# Altium footprint library B105ic.PcbLib: 84 footprints (part 6 of 6)
Each footprint in its own frame and in the unit in brackets; x right, y up, seen from the top. Pads: shape width x height; smd on the part's side, far side on the other; paste and mask are expansions set on the pad; w line width, h text height; cw(c..) or ccw(c..) is an arc to the next point about the centre after c.
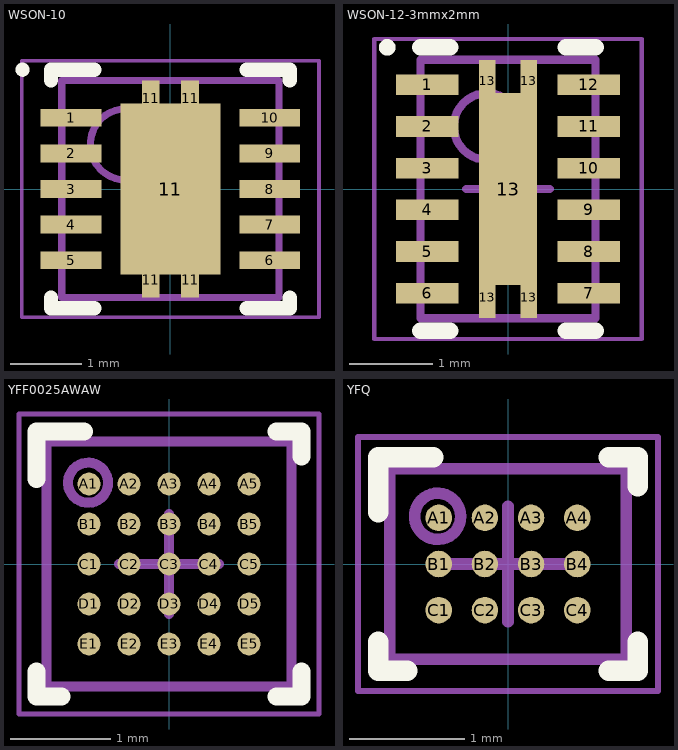
[diagram p5: the footprints below, top view; thin cyan lines are the x and y axes]

## WSON-10 [mm] "SON, 10-Leads, Body 3,00x3,00mm, Pitch 0,50mm, Thermal Pad 2,40x1,50mm, IPC Medium Density"
height 0.8
pads (15):
  rect 0.85x0.25 smd: 1(-1.395,1) 2(-1.395,0.5) 3(-1.395,0) 4(-1.395,-0.5) 5(-1.395,-1) 6(1.395,-1) 7(1.395,-0.5) 8(1.395,0) 9(1.395,0.5) 10(1.395,1)
  rect 0.25x0.5 smd: 11(-0.275,-1.275) 11(-0.275,1.275) 11(0.275,-1.275) 11(0.275,1.275)
  rect 1.4x2.4 smd: 11(0,0)
Top Overlay:
  circle w0.1: c-2.075,1.675 r0.05
  lines w0.2: -1.675,-1.525 -1.675,-1.675 -1.07,-1.675 ; -1.675,1.525 -1.675,1.675 -1.07,1.675 ; 1.07,-1.675 1.675,-1.675 1.675,-1.525 ; 1.07,1.675 1.675,1.675 1.675,1.525
Mechanical 13:
  circle w0.1: c-0.625,0.625 r0.5
  lines w0.1: -1.525,-1.525 1.525,-1.525 1.525,1.525 -1.525,1.525 -1.525,-1.525
Mechanical 15:
  lines w0.05: -2.085,-1.8 2.085,-1.8 2.085,1.8 -2.085,1.8 -2.085,-1.8
  lines w0.1: -0.5,0 0.5,0 ; 0,-0.5 0,0.5
3D body "10WSON.step": height 0.7, standoff 0.01, extent -1.5,-1.495 1.51,1.505

## WSON-12-3mmx2mm [mm] "SON, 12-Leads, Body 3,00x2,00mm, Pitch 0,50mm, Thermal Pad 2,30x0,70mm, IPC Medium Density"
height 0.8
pads (17):
  rect 0.75x0.25 smd: 1(-0.97,1.25) 2(-0.97,0.75) 3(-0.97,0.25) 4(-0.97,-0.25) 5(-0.97,-0.75) 6(-0.97,-1.25) 7(0.97,-1.25) 8(0.97,-0.75) 9(0.97,-0.25) 10(0.97,0.25) 11(0.97,0.75) 12(0.97,1.25)
  rect 0.2x0.5 smd: 13(-0.25,-1.3) 13(-0.25,1.3) 13(0.25,-1.3) 13(0.25,1.3)
  rect 0.7x2.3 smd: 13(0,0)
Top Overlay:
  circle w0.1: c-1.45,1.7 r0.05
  lines w0.2: -1.05,-1.7 -0.695,-1.7 ; -1.05,1.7 -0.695,1.7 ; 0.695,-1.7 1.05,-1.7 ; 0.695,1.7 1.05,1.7
Mechanical 13:
  circle w0.1: c-0.25,0.75 r0.4
  lines w0.1: -1.05,-1.55 -1.05,1.55 1.05,1.55 1.05,-1.55 -1.05,-1.55
Mechanical 15:
  lines w0.05: -1.605,-1.8 -1.605,1.8 1.605,1.8 1.605,-1.8 -1.605,-1.8
  lines w0.1: -0.5,0 0.5,0 ; 0,-0.5 0,0.5
3D body "WSON12.step": height 0.8, standoff 0, extent -1.05,-1.55 1.05,1.55

## YFF0025AWAW [mm]
pads (25):
  round 0.23 smd paste-0.13 mask+0.04: A1(-0.8,0.8) A2(-0.4,0.8) A3(0,0.8) A4(0.4,0.8) A5(0.8,0.8) B1(-0.8,0.4) B2(-0.4,0.4) B3(0,0.4) B4(0.4,0.4) B5(0.8,0.4) C1(-0.8,0) C2(-0.4,0) C3(0,0) C4(0.4,0) C5(0.8,0) D1(-0.8,-0.4) D2(-0.4,-0.4) D3(0,-0.4) D4(0.4,-0.4) D5(0.8,-0.4) E1(-0.8,-0.8) E2(-0.4,-0.8) E3(0,-0.8) E4(0.4,-0.8) E5(0.8,-0.8)
Top Overlay:
  lines w0.18: -1.325,-1.075 -1.325,-1.325 -1.075,-1.325 ; -1.325,0.85 -1.325,1.325 -0.85,1.325 ; 1.075,-1.325 1.325,-1.325 1.325,-1.075 ; 1.075,1.325 1.325,1.325 1.325,1.075
Top Paste:
  drawing of 225 lines, arcs and shapes, not listed
Mechanical 5:
  circle w0.1: c-0.81,0.813 r0.2
  lines w0.1: -1.225,-1.225 -1.225,1.225 1.225,1.225 1.225,-1.225 -1.225,-1.225
  text ".Designator" at -1.092,-0.279 h0.6
Mechanical 15:
  lines w0.05: -1.5,-1.5 1.5,-1.5 1.5,1.5 -1.5,1.5 -1.5,-1.5
  lines w0.1: -0.5,0 0.5,0 ; 0,-0.5 0,0.5
3D body: height 0.64, standoff 0.63, extent -1.009,0.613 -0.61,1.012
3D body: height 0.63, standoff 0, extent -1.225,-1.225 1.225,1.225

## YFQ [mm]
pads (12):
  round 0.23 smd paste-0.13 mask+0.04: A1(-0.6,0.4) A2(-0.2,0.4) A3(0.2,0.4) A4(0.6,0.4) B1(-0.6,0) B2(-0.2,0) B3(0.2,0) B4(0.6,0) C1(-0.6,-0.4) C2(-0.2,-0.4) C3(0.2,-0.4) C4(0.6,-0.4)
Top Overlay:
  lines w0.18: -1.125,-0.675 -1.125,-0.925 -0.875,-0.925 ; -1.125,0.45 -1.125,0.925 -0.65,0.925 ; 0.875,-0.925 1.125,-0.925 1.125,-0.675 ; 0.875,0.925 1.125,0.925 1.125,0.675
Top Paste:
  circle w0.05: c0.675,0.475 r0.025
  circle w0.05: c0.525,0.325 r0.025
  circle w0.05: c0.525,0.475 r0.025
  circle w0.05: c0.675,0.325 r0.025
  circle w0.05: c0.275,0.475 r0.025
  circle w0.05: c0.125,0.325 r0.025
  circle w0.05: c0.125,0.475 r0.025
  circle w0.05: c0.275,0.325 r0.025
  circle w0.05: c-0.125,0.475 r0.025
  circle w0.05: c-0.275,0.325 r0.025
  circle w0.05: c-0.275,0.475 r0.025
  circle w0.05: c-0.125,0.325 r0.025
  circle w0.05: c-0.525,0.325 r0.025
  circle w0.05: c-0.675,0.475 r0.025
  circle w0.05: c-0.675,0.325 r0.025
  circle w0.05: c-0.525,0.475 r0.025
  circle w0.05: c0.675,0.075 r0.025
  circle w0.05: c0.525,-0.075 r0.025
  circle w0.05: c0.525,0.075 r0.025
  circle w0.05: c0.675,-0.075 r0.025
  circle w0.05: c0.275,0.075 r0.025
  circle w0.05: c0.125,-0.075 r0.025
  circle w0.05: c0.125,0.075 r0.025
  circle w0.05: c0.275,-0.075 r0.025
  circle w0.05: c-0.125,0.075 r0.025
  circle w0.05: c-0.275,-0.075 r0.025
  circle w0.05: c-0.275,0.075 r0.025
  circle w0.05: c-0.125,-0.075 r0.025
  circle w0.05: c-0.525,-0.075 r0.025
  circle w0.05: c-0.675,0.075 r0.025
  circle w0.05: c-0.675,-0.075 r0.025
  circle w0.05: c-0.525,0.075 r0.025
  circle w0.05: c0.675,-0.325 r0.025
  circle w0.05: c0.525,-0.475 r0.025
  circle w0.05: c0.525,-0.325 r0.025
  circle w0.05: c0.675,-0.475 r0.025
  circle w0.05: c0.275,-0.325 r0.025
  circle w0.05: c0.125,-0.475 r0.025
  circle w0.05: c0.125,-0.325 r0.025
  circle w0.05: c0.275,-0.475 r0.025
  circle w0.05: c-0.125,-0.325 r0.025
  circle w0.05: c-0.275,-0.475 r0.025
  circle w0.05: c-0.275,-0.325 r0.025
  circle w0.05: c-0.125,-0.475 r0.025
  circle w0.05: c-0.525,-0.475 r0.025
  circle w0.05: c-0.675,-0.325 r0.025
  circle w0.05: c-0.675,-0.475 r0.025
  circle w0.05: c-0.525,-0.325 r0.025
  rectangle: 0.525,0.275 0.675,0.325
  region: 0.475,0.475 0.475,0.325 0.525,0.325 0.525,0.475
  region: 0.675,0.525 0.525,0.525 0.525,0.475 0.675,0.475
  region: 0.725,0.325 0.725,0.475 0.675,0.475 0.675,0.325
  region: 0.525,0.475 0.525,0.325 0.675,0.325 0.675,0.475
  rectangle: 0.125,0.275 0.275,0.325
  region: 0.075,0.475 0.075,0.325 0.125,0.325 0.125,0.475
  region: 0.275,0.525 0.125,0.525 0.125,0.475 0.275,0.475
  region: 0.325,0.325 0.325,0.475 0.275,0.475 0.275,0.325
  region: 0.125,0.475 0.125,0.325 0.275,0.325 0.275,0.475
  rectangle: -0.275,0.275 -0.125,0.325
  region: -0.325,0.475 -0.325,0.325 -0.275,0.325 -0.275,0.475
  region: -0.125,0.525 -0.275,0.525 -0.275,0.475 -0.125,0.475
  region: -0.075,0.325 -0.075,0.475 -0.125,0.475 -0.125,0.325
  region: -0.275,0.475 -0.275,0.325 -0.125,0.325 -0.125,0.475
  region: -0.675,0.475 -0.675,0.325 -0.525,0.325 -0.525,0.475
  region: -0.475,0.325 -0.475,0.475 -0.525,0.475 -0.525,0.325
  region: -0.525,0.525 -0.675,0.525 -0.675,0.475 -0.525,0.475
  region: -0.725,0.475 -0.725,0.325 -0.675,0.325 -0.675,0.475
  rectangle: -0.675,0.275 -0.525,0.325
  rectangle: 0.525,-0.125 0.675,-0.075
  region: 0.475,0.075 0.475,-0.075 0.525,-0.075 0.525,0.075
  region: 0.675,0.125 0.525,0.125 0.525,0.075 0.675,0.075
  region: 0.725,-0.075 0.725,0.075 0.675,0.075 0.675,-0.075
  region: 0.525,0.075 0.525,-0.075 0.675,-0.075 0.675,0.075
  rectangle: 0.125,-0.125 0.275,-0.075
  region: 0.075,0.075 0.075,-0.075 0.125,-0.075 0.125,0.075
  region: 0.275,0.125 0.125,0.125 0.125,0.075 0.275,0.075
  region: 0.325,-0.075 0.325,0.075 0.275,0.075 0.275,-0.075
  region: 0.125,0.075 0.125,-0.075 0.275,-0.075 0.275,0.075
  rectangle: -0.275,-0.125 -0.125,-0.075
  region: -0.325,0.075 -0.325,-0.075 -0.275,-0.075 -0.275,0.075
  region: -0.125,0.125 -0.275,0.125 -0.275,0.075 -0.125,0.075
  region: -0.075,-0.075 -0.075,0.075 -0.125,0.075 -0.125,-0.075
  region: -0.275,0.075 -0.275,-0.075 -0.125,-0.075 -0.125,0.075
  region: -0.675,0.075 -0.675,-0.075 -0.525,-0.075 -0.525,0.075
  region: -0.475,-0.075 -0.475,0.075 -0.525,0.075 -0.525,-0.075
  region: -0.525,0.125 -0.675,0.125 -0.675,0.075 -0.525,0.075
  region: -0.725,0.075 -0.725,-0.075 -0.675,-0.075 -0.675,0.075
  rectangle: -0.675,-0.125 -0.525,-0.075
  rectangle: 0.525,-0.525 0.675,-0.475
  region: 0.475,-0.325 0.475,-0.475 0.525,-0.475 0.525,-0.325
  region: 0.675,-0.275 0.525,-0.275 0.525,-0.325 0.675,-0.325
  region: 0.725,-0.475 0.725,-0.325 0.675,-0.325 0.675,-0.475
  region: 0.525,-0.325 0.525,-0.475 0.675,-0.475 0.675,-0.325
  rectangle: 0.125,-0.525 0.275,-0.475
  region: 0.075,-0.325 0.075,-0.475 0.125,-0.475 0.125,-0.325
  region: 0.275,-0.275 0.125,-0.275 0.125,-0.325 0.275,-0.325
  region: 0.325,-0.475 0.325,-0.325 0.275,-0.325 0.275,-0.475
  region: 0.125,-0.325 0.125,-0.475 0.275,-0.475 0.275,-0.325
  rectangle: -0.275,-0.525 -0.125,-0.475
  region: -0.325,-0.325 -0.325,-0.475 -0.275,-0.475 -0.275,-0.325
  region: -0.125,-0.275 -0.275,-0.275 -0.275,-0.325 -0.125,-0.325
  region: -0.075,-0.475 -0.075,-0.325 -0.125,-0.325 -0.125,-0.475
  region: -0.275,-0.325 -0.275,-0.475 -0.125,-0.475 -0.125,-0.325
  region: -0.675,-0.325 -0.675,-0.475 -0.525,-0.475 -0.525,-0.325
  region: -0.475,-0.475 -0.475,-0.325 -0.525,-0.325 -0.525,-0.475
  region: -0.525,-0.275 -0.675,-0.275 -0.675,-0.325 -0.525,-0.325
  region: -0.725,-0.325 -0.725,-0.475 -0.675,-0.475 -0.675,-0.325
  rectangle: -0.675,-0.525 -0.525,-0.475
Mechanical 5:
  circle w0.1: c-0.61,0.413 r0.2
  lines w0.1: -1.025,-0.825 1.025,-0.825 1.025,0.825 -1.025,0.825 -1.025,-0.825
  text ".Designator" at -0.7,-0.6 h0.6
Mechanical 15:
  lines w0.05: -1.3,-1.1 -1.3,1.1 1.3,1.1 1.3,-1.1 -1.3,-1.1
  lines w0.1: -0.5,0 0.5,0 ; 0,-0.5 0,0.5
3D body: height 0.64, standoff 0.63, extent -0.809,0.213 -0.41,0.612
3D body: height 0.63, standoff 0, extent -1.025,-0.825 1.025,0.825